# Altium footprint library Components_Footprints.PcbLib: 29 footprints (part 2 of 2)
Each footprint in its own frame and in the unit in brackets; x right, y up, seen from the top. Pads: shape width x height; smd on the part's side, far side on the other; paste and mask are expansions set on the pad; w line width, h text height; cw(c..) or ccw(c..) is an arc to the next point about the centre after c.
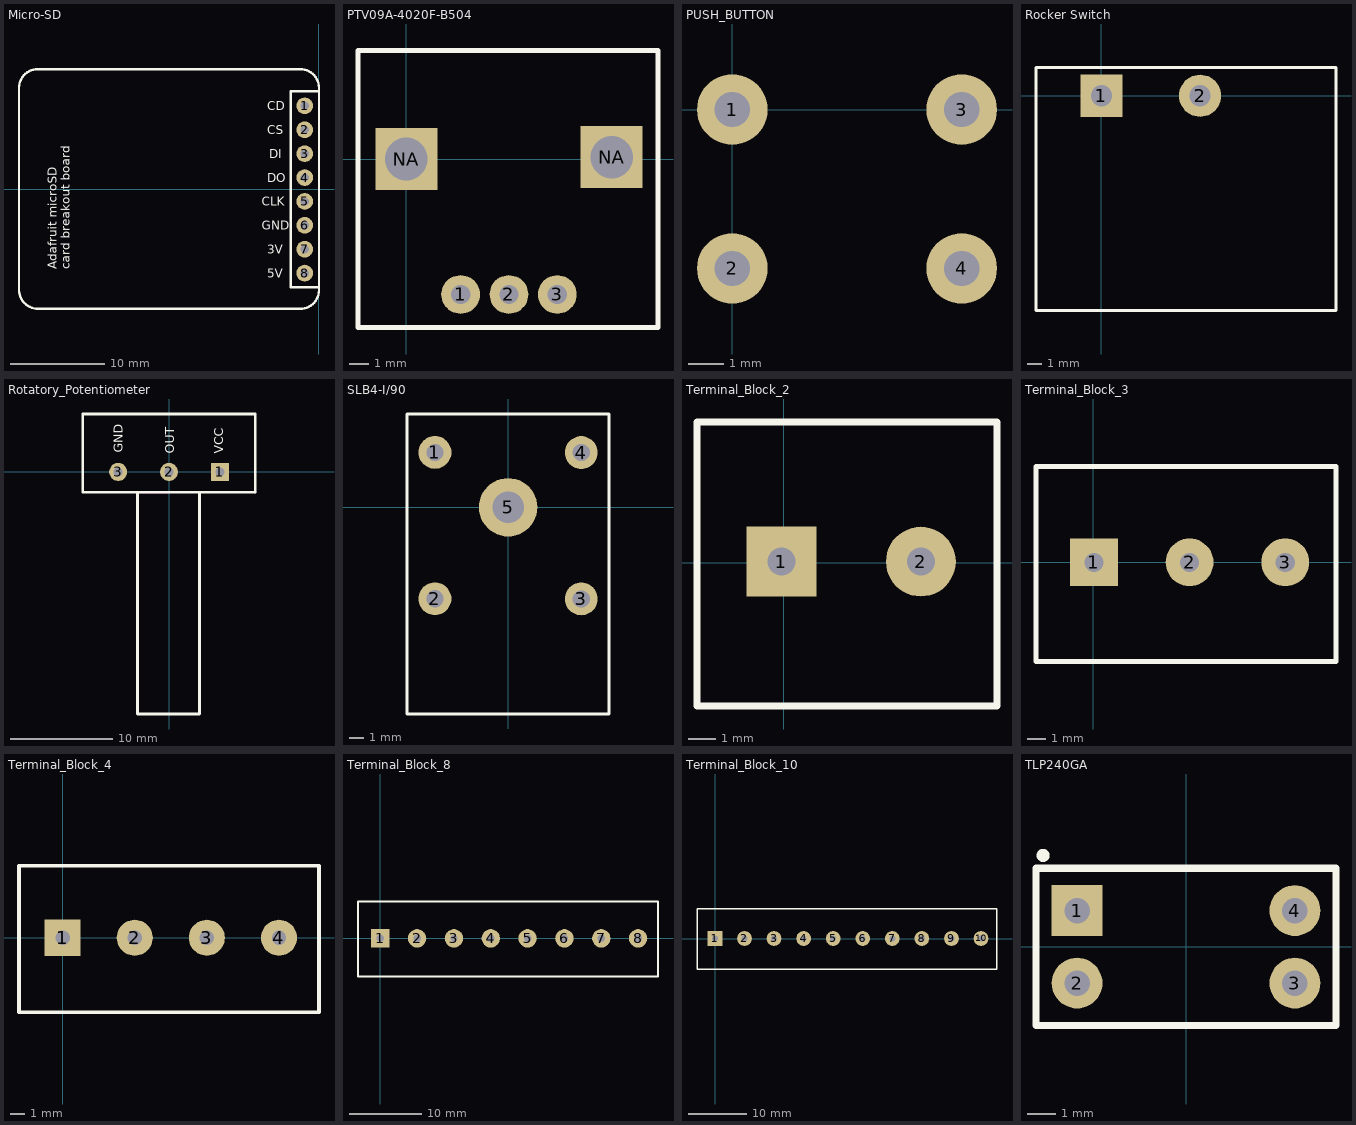
[diagram p1: the footprints below, top view; thin cyan lines are the x and y axes]

## Micro-SD [mil] "Adafruit Micro SD Card Breakout Board"
pads (8):
  round 70 hole 35: 1(-59,348) 2(-59,248) 3(-59,148) 4(-59,48) 5(-59,-52) 6(-59,-152) 7(-59,-252) 8(-59,-352)
Top Overlay:
  lines w10: -1254.91,-423.16 ccw(c-1174.2,-421.19) -1172.23,-501.9 -77.74,-501.9 ccw(c-77.74,-423.16) 1,-423.16 1,423.3 ccw(c-77.74,423.3) -77.74,502.04 -1176.17,502.04 ccw(c-1176.17,423.3) -1254.91,423.3 -1254.91,-419.22 ; -116.95,-411.05 -116.95,409.18 0,409.18 ; -116.59,-411.41 -3.92,-411.41
  text "CD" at -215.39,329.18 h36
  text "CS" at -215.39,229.18 h36
  text "DI" at -207.51,129.18 h36
  text "DO" at -215.39,29.18 h36
  text "CLK" at -239,-70.82 h36
  text "GND" at -239,-170.82 h36
  text "3V" at -215.39,-270.82 h36
  text "5V" at -215.39,-370.82 h36
  text "Adafruit microSD  / card breakout board" at -1042.23,-335 h36
3D body "Ada microsd.SLDPRT": height 402.36, standoff 300, extent -1454.68,-498 -11,502
3D body "8-Pin Header - Male - 2.54mm.step": height 420, standoff -50, extent -109.01,-401.99 -9.01,398.01
3D body "8-Pin Header - Female - 2.54mm.step": height 196.85, standoff -118.11, extent -104.21,-415 -5.79,404.69

## PGA56x10 [mil]

## PTV09A-4020F-B504 [mm] "Potenciómetros PANEL CONTROL - 9MM-ST-CARBON"
pads (5):
  round 2 hole 1: 1(2.8,-7) 2(5.3,-7) 3(7.8,-7)
  rect 3.2x3.2 hole 2.2: NA(0,0) NA(10.6,0.1)
Top Overlay:
  lines w0.254: -2.5,-8.7 5.3,-8.7 13,-8.7 13,0.1 13,5.6 -2.5,5.6 -2.5,0 -2.5,-8.7
3D body "R-0904N-L-25KQ.step": height 26, standoff -2.8, extent -0.361,-7.1 10.961,5.5

## PUSH_BUTTON [mm]
pads (4):
  round 2 hole 1: 1(0,0) 2(0,-4.5) 3(6.5,0) 4(6.5,-4.5)
3D body "tactileswitch-short.STEP": height 4.95, standoff -3.38, extent -0.543,-5.289 7.148,0.718

## Rocker Switch [mm] "SPST (right-angle)"
height 13
pads (2):
  rect 3x3 hole 1.5: 1(0,0)
  round 3 hole 1.5: 2(7,0)
Top Overlay:
  lines w0.203: -4.65,-15.24 16.65,-15.24 16.65,2 -4.65,2 -4.65,-15.24
3D body "Switch1.SLDPRT": height 14.4, standoff -5, extent -4.605,-21.504 16.695,0.622

## Rotatory_Potentiometer [mil]
height 984.25
pads (3):
  rect 70x70 hole 35: 1(196.85,0)
  round 70 hole 35: 2(0,0) 3(-196.85,0)
Top Overlay:
  lines w10: -122.05,-78.74 -122.05,-937.01 118.11,-937.01 118.11,-78.74 ; -334.65,-78.74 334.65,-78.74 334.65,224.41 -334.65,224.41 -334.65,-78.74
  text "GND" at -180,75 h36
  text "OUT" at 20,70 h36
  text "VCC" at 210,70 h36
Mechanical 1:
  lines w10: -122.05,-78.74 0,-78.74 ; 334.65,-78.74 334.65,-78.74
3D body "POTENTIOMETER.STEP": height 836.61, standoff -147.64, extent -334.64,-921.25 334.65,208.67

## SLB4-I/90 [mil]
pads (5):
  round 90 hole 47.24: 1(-200,150) 2(-200,-250) 3(200,-250.39) 4(200,149.61)
  round 160 hole 86.61: 5(0,0)
Top Overlay:
  lines w8: -276.22,-565 275.59,-565 275.59,255 -276.22,255 -276.22,-565
3D body "S16N-PC-BLACK.step": height 482.76, standoff -143.23, extent -232.44,-1081.17 240,218.04

## Terminal_Block_2 [mil]
pads (2):
  rect 100x100 hole 40: 1(-3,2)
  round 100 hole 40: 2(197,2)
Top Overlay:
  lines w10: -124,-205 -124,202 306,202 306,-205 -124,-205
3D body "2er Terminal Block.step": height 551.18, standoff -167.32, extent -117.87,-203 297.87,190.7

## Terminal_Block_3 [mil]
pads (3):
  rect 100x100 hole 40: 1(1,0)
  round 100 hole 40: 2(201,0) 3(401,0)
Top Overlay:
  lines w10: -120,-207 507,-207 507,200 -120,200 -120,-207
3D body "3er Terminal Block.step": height 551.18, standoff -167.32, extent -116,-203.85 499.75,189.85

## Terminal_Block_4 [mil]
pads (4):
  rect 100x100 hole 40: 1(0,0)
  round 100 hole 40: 2(200,0) 3(400,0) 4(600,0)
Top Overlay:
  lines w10: -121,-207 -121,200 711,200 711,-207 -121,-207
3D body "4er Terminal Block.step": height 551.18, standoff -167.32, extent -114.87,-200 700.87,193.7

## Terminal_Block_8 [mil]
pads (8):
  rect 100x100 hole 40: 1(-1,0)
  round 100 hole 40: 2(199,0) 3(399,0) 4(599,0) 5(799,0) 6(999,0) 7(1199,0) 8(1399,0)
Top Overlay:
  lines w10: -122,-207 -122,200 1507,200 1507,-207 -122,-207
3D body "8er Terminal Block.step": height 551.18, standoff -167.32, extent -115.87,-202 1499.87,191.7

## Terminal_Block_10 [mil]
pads (10):
  rect 100x100 hole 40: 1(-1,1)
  round 100 hole 40: 2(199,1) 3(399,1) 4(599,1) 5(799,1) 6(999,1) 7(1199,1) 8(1399,1) 9(1599,1) 10(1799,1)
Top Overlay:
  lines w10: -122,-206 -122,201 1907,201 1907,-206 -122,-206
3D body "10er Terminal Block.step": height 551.18, standoff -167.32, extent -115,-200 1900.75,193.7

## TLP240GA [mil]
pads (4):
  rect 70x70 hole 35: 1(-150,50)
  round 70 hole 35: 2(-150,-50) 3(150,-50) 4(150,50)
Top Overlay:
  circle w10: c-196.85,125.98 r3.94
  lines w10: -206.69,-108.27 -206.69,108.27 206.69,108.27 206.69,-108.27 -206.69,-108.27
3D body "PC817-4Pole-Sharp.SLDPRT": height 157.48, standoff -118.11, extent -155,-85 145,92.16